# Altium integrated library Res-THP_V2.IntLib: 460 symbols (part 1 of 3)
Pins are listed as number, name and electrical type; pins without a type are passive.

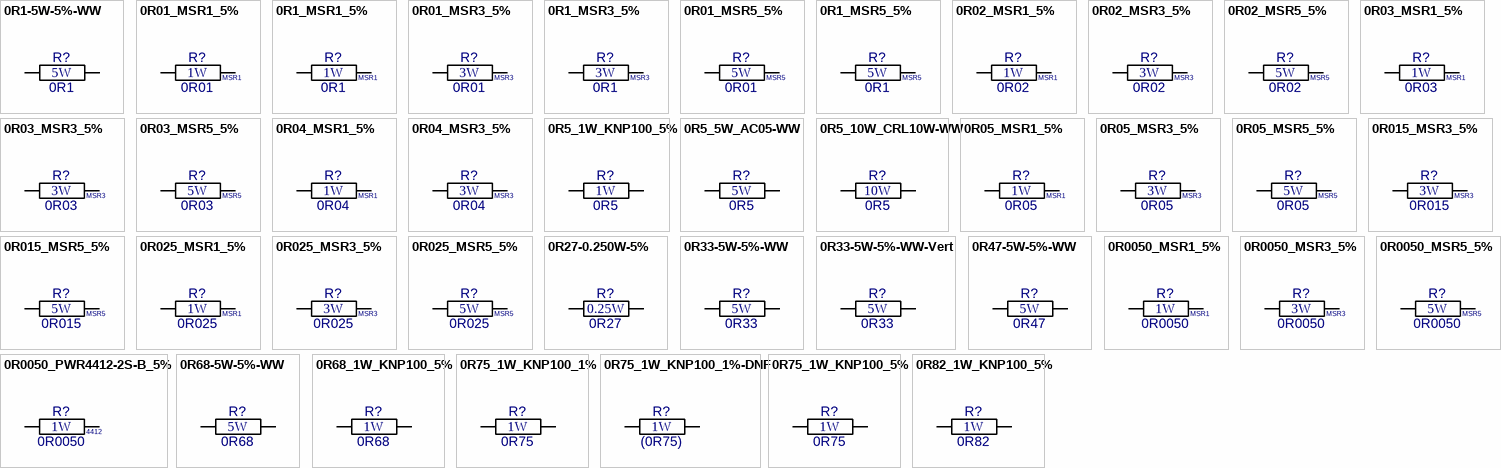
[diagram p0: symbols 0R1-5W-5%-WW to 0R82_1W_KNP100_5%]

## 0R1-5W-5%-WW
designator R?  value 0R1  Watt: 5W  (hidden comment: 0R1-5W-5%-WW)
Resistor Wirewound; Manufacturer: Various; Part Number: 0R1 5% 5W WW; Tol: 5%; Package: RES-5W-WW; EDM-PN: *; Text2: *; Text1: *
footprint Res-5W-WW (Res 5W WW 17.0x7.5mm)
pins: 1, 2

## 0R01_MSR1_5%
designator R?, comment value 0R01  Watt: 1W  Text1: MSR1  (hidden comment: MSR 1 R01 J)
Resistor Bare Metal Element; Manufacturer: Arcol; Tol: 5%; Part Number: MSR 1 R01 J; Package: RES-MSR1; EDM-PN: *; Text2: *
footprint RES-MSR1 (MSR1 11.43x4.8mm)
pins: 1, 2

## 0R1_MSR1_5%
designator R?  value 0R1  Watt: 1W  Text1: MSR1  (hidden comment: 0R1_MSR1_5%)
Resistor Bare Metal Element; Manufacturer: Arcol; Part Number: MSR 1 R1 J; Tol: 5%; Package: RES-MSR1; EDM-PN: *; Text2: *
footprint RES-MSR1 (MSR1 11.43x4.8mm)
pins: 1, 2

## 0R01_MSR3_5%
designator R?, comment value 0R01  Watt: 3W  Text1: MSR3  (hidden comment: MSR 3 R01 J)
Resistor Bare Metal Element; Manufacturer: Arcol; Tol: 5%; Part Number: MSR 3 R01 J; Package: RES-MSR3; EDM-PN: *; Text2: *
footprint RES-MSR3 (MSR3 15.2x4.8mm)
pins: 1, 2

## 0R1_MSR3_5%
designator R?  value 0R1  Watt: 3W  Text1: MSR3  (hidden comment: 0R1_MSR3_5%)
Resistor Bare Metal Element; Manufacturer: Arcol; Part Number: MSR 3 R1 J; Tol: 5%; Package: RES-MSR3; EDM-PN: *; Text2: *
footprint RES-MSR3 (MSR3 15.2x4.8mm)
pins: 1, 2

## 0R01_MSR5_5%
designator R?, comment value 0R01  Watt: 5W  Text1: MSR5  (hidden comment: MSR 5 R01 J)
Resistor Bare Metal Element; Manufacturer: Arcol; Tol: 5%; Part Number: MSR 5 R01 J; Package: RES-MSR5; EDM-PN: *; Text2: *
footprint RES-MSR5 (MSR5 20.3x4.8mm)
pins: 1, 2

## 0R1_MSR5_5%
designator R?  value 0R1  Watt: 5W  Text1: MSR5  (hidden comment: 0R1_MSR5_5%)
Resistor Bare Metal Element; Manufacturer: Arcol; Part Number: MSR 5 R1 J; Tol: 5%; Package: RES-MSR5; EDM-PN: *; Text2: *
footprint RES-MSR5 (MSR5 20.3x4.8mm)
pins: 1, 2

## 0R02_MSR1_5%
designator R?  value 0R02  Watt: 1W  Text1: MSR1  (hidden comment: 0R02_MSR1_5%)
Resistor Bare Metal Element; Manufacturer: Arcol; Part Number: MSR 1 R02 J; Tol: 5%; Package: RES-MSR1; EDM-PN: *; Text2: *
footprint RES-MSR1 (MSR1 11.43x4.8mm)
pins: 1, 2

## 0R02_MSR3_5%
designator R?  value 0R02  Watt: 3W  Text1: MSR3  (hidden comment: 0R02_MSR3_5%)
Resistor Bare Metal Element; Manufacturer: Arcol; Part Number: MSR 3 R02 J; Tol: 5%; Package: RES-MSR3; EDM-PN: *; Text2: *
footprint RES-MSR3 (MSR3 15.2x4.8mm)
pins: 1, 2

## 0R02_MSR5_5%
designator R?  value 0R02  Watt: 5W  Text1: MSR5  (hidden comment: 0R02_MSR5_5%)
Resistor Bare Metal Element; Manufacturer: Arcol; Part Number: MSR 5 R02 J; Tol: 5%; Package: RES-MSR5; EDM-PN: *; Text2: *
footprint RES-MSR5 (MSR5 20.3x4.8mm)
pins: 1, 2

## 0R03_MSR1_5%
designator R?  value 0R03  Watt: 1W  Text1: MSR1  (hidden comment: 0R03_MSR1_5%)
Resistor Bare Metal Element; Manufacturer: Arcol; Part Number: MSR 1 R03 J; Tol: 5%; Package: RES-MSR1; EDM-PN: *; Text2: *
footprint RES-MSR1 (MSR1 11.43x4.8mm)
pins: 1, 2

## 0R03_MSR3_5%
designator R?  value 0R03  Watt: 3W  Text1: MSR3  (hidden comment: 0R03_MSR3_5%)
Resistor Bare Metal Element; Manufacturer: Arcol; Part Number: MSR 3 R03 J; Tol: 5%; Package: RES-MSR3; EDM-PN: *; Text2: *
footprint RES-MSR3 (MSR3 15.2x4.8mm)
pins: 1, 2

## 0R03_MSR5_5%
designator R?  value 0R03  Watt: 5W  Text1: MSR5  (hidden comment: 0R03_MSR5_5%)
Resistor Bare Metal Element; Manufacturer: Arcol; Part Number: MSR 5 R03 J; Tol: 5%; Package: RES-MSR5; EDM-PN: *; Text2: *
footprint RES-MSR5 (MSR5 20.3x4.8mm)
pins: 1, 2

## 0R04_MSR1_5%
designator R?  value 0R04  Watt: 1W  Text1: MSR1  (hidden comment: 0R04_MSR1_5%)
Resistor Bare Metal Element; Manufacturer: Arcol; Part Number: MSR 1 R04 J; Tol: 5%; Package: RES-MSR1; EDM-PN: *; Text2: *
footprint RES-MSR1 (MSR1 11.43x4.8mm)
pins: 1, 2

## 0R04_MSR3_5%
designator R?  value 0R04  Watt: 3W  Text1: MSR3  (hidden comment: 0R04_MSR3_5%)
Resistor Bare Metal Element; Manufacturer: Arcol; Part Number: MSR 3 R04 J; Tol: 5%; Package: RES-MSR3; EDM-PN: *; Text2: *
footprint RES-MSR3 (MSR3 15.2x4.8mm)
pins: 1, 2

## 0R5_1W_KNP100_5%
designator R?, comment value 0R5  Watt: 1W  (hidden comment: 0R5_1W_KNP100_5%_H)
Resistor Wirewound; Manufacturer: Yageo; Part Number: KNP100JR-73-0R5; Tol: 5%; Package: RES-KNP100; EDM-PN: *; Text2: *; Text1: *
footprint RES-KNP100 (RES 1W PMW 11.5x4.5mm)
pins: 1, 2

## 0R5_5W_AC05-WW
designator R?, comment value 0R5  Watt: 5W  (hidden comment: 0R5-AC05-WW)
Resistor Wirewound; Manufacturer: Various; Part Number: 0R5 5% AC05; Tol: 5%; Package: RES-AC05; EDM-PN: *; Text2: *; Text1: *
footprint Res-AC05 (Res AC05 18.0x10.0mm)
pins: 1, 2

## 0R5_10W_CRL10W-WW
designator R?  value 0R5  Watt: 10W  (hidden comment: 0R5_10W_CRL10W-WW)
Resistor Wirewound Ceramic; Manufacturer: Various; Part Number: CRL10W-R51; Tol: 5%; Package: RES-CRL10W; EDM-PN: *; Text2: *; Text1: *
footprint RES-CRL10W (CRL10W  48.0x9.5mm)
pins: 1, 2

## 0R05_MSR1_5%
designator R?  value 0R05  Watt: 1W  Text1: MSR1  (hidden comment: 0R05_MSR1_5%)
Resistor Bare Metal Element; Manufacturer: Arcol; Part Number: MSR 1 R05 J; Tol: 5%; Package: RES-MSR1; EDM-PN: *; Text2: *
footprint RES-MSR1 (MSR1 11.43x4.8mm)
pins: 1, 2

## 0R05_MSR3_5%
designator R?  value 0R05  Watt: 3W  Text1: MSR3  (hidden comment: 0R05_MSR3_5%)
Resistor Bare Metal Element; Manufacturer: Arcol; Part Number: MSR 3 R05 J; Tol: 5%; Package: RES-MSR3; EDM-PN: *; Text2: *
footprint RES-MSR3 (MSR3 15.2x4.8mm)
pins: 1, 2

## 0R05_MSR5_5%
designator R?  value 0R05  Watt: 5W  Text1: MSR5  (hidden comment: 0R05_MSR5_5%)
Resistor Bare Metal Element; Manufacturer: Arcol; Part Number: MSR 5 R05 J; Tol: 5%; Package: RES-MSR5; EDM-PN: *; Text2: *
footprint RES-MSR5 (MSR5 20.3x4.8mm)
pins: 1, 2

## 0R015_MSR3_5%
designator R?  value 0R015  Watt: 3W  Text1: MSR3  (hidden comment: 0R015_MSR3_5%)
Resistor Bare Metal Element; Manufacturer: Arcol; Part Number: MSR 3 R015 J; Tol: 5%; Package: RES-MSR3; EDM-PN: *; Text2: *
footprint RES-MSR3 (MSR3 15.2x4.8mm)
pins: 1, 2

## 0R015_MSR5_5%
designator R?  value 0R015  Watt: 5W  Text1: MSR5  (hidden comment: 0R015_MSR5_5%)
Resistor Bare Metal Element; Manufacturer: Arcol; Part Number: MSR 5 R015 J; Tol: 5%; Package: RES-MSR5; EDM-PN: *; Text2: *
footprint RES-MSR5 (MSR5 20.3x4.8mm)
pins: 1, 2

## 0R025_MSR1_5%
designator R?  value 0R025  Watt: 1W  Text1: MSR1  (hidden comment: 0R025_MSR1_5%)
Resistor Bare Metal Element; Manufacturer: Arcol; Part Number: MSR 1 R025 J; Tol: 5%; Package: RES-MSR1; EDM-PN: *; Text2: *
footprint RES-MSR1 (MSR1 11.43x4.8mm)
pins: 1, 2

## 0R025_MSR3_5%
designator R?  value 0R025  Watt: 3W  Text1: MSR3  (hidden comment: 0R025_MSR3_5%)
Resistor Bare Metal Element; Manufacturer: Arcol; Part Number: MSR 3 R025 J; Tol: 5%; Package: RES-MSR3; EDM-PN: *; Text2: *
footprint RES-MSR3 (MSR3 15.2x4.8mm)
pins: 1, 2

## 0R025_MSR5_5%
designator R?  value 0R025  Watt: 5W  Text1: MSR5  (hidden comment: 0R025_MSR5_5%)
Resistor Bare Metal Element; Manufacturer: Arcol; Part Number: MSR 5 R025 J; Tol: 5%; Package: RES-MSR5; EDM-PN: *; Text2: *
footprint RES-MSR5 (MSR5 20.3x4.8mm)
pins: 1, 2

## 0R27-0.250W-5%
designator R?, comment value 0R27  Watt: 0.25W  (hidden comment: 0R27-0.250W-5%_H)
Resistor Metal Film; Manufacturer: Various; Part Number: 0R27 5% 0.25W; Tol: 5%; Package: RES-0.250W; EDM-PN: *; Text2: *; Text1: *
footprint RES-0.250W (Res 0.25W 7.6x2.3mm)
pins: 1, 2

## 0R33-5W-5%-WW
designator R?  value 0R33  Watt: 5W  (hidden comment: 0R33-5W-5%-WW)
Resistor Wirewound; Manufacturer: Various; Part Number: 0R33 5% 5W WW; Tol: 5%; Package: RES-5W-WW; EDM-PN: *; Text2: *; Text1: *
footprint Res-5W-WW (Res 5W WW 17.0x7.5mm)
pins: 1, 2

## 0R33-5W-5%-WW-Vert
designator R?, comment value 0R33  Watt: 5W  (hidden comment: 0R33-5W-5%-WW)
Resistor Wirewound; Manufacturer: Various; Part Number: 0R33 5% 5W WW; Tol: 5%; Package: RES-5W-WW-Vert; EDM-PN: *; Text2: *; Text1: *
footprint Res-5W-WW-Vert (Res AC05 18.0x10.0mm)
pins: 1, 2

## 0R47-5W-5%-WW
designator R?  value 0R47  Watt: 5W  (hidden comment: 0R47-5W-5%-WW)
Resistor Wirewound; Manufacturer: Various; Part Number: 0R47 5% 5W WW; EDM-PN: RES1410; Tol: 5%; Package: RES-5W-WW; Text2: *; Text1: *
footprint Res-5W-WW (Res 5W WW 17.0x7.5mm)
pins: 1, 2

## 0R0050_MSR1_5%
designator R?  value 0R0050  Watt: 1W  Text1: MSR1  (hidden comment: 0R0050_MSR1_5%)
Resistor Bare Metal Element; Manufacturer: Arcol; Part Number: MSR 1 R0050 J; Tol: 5%; Package: RES-MSR1; EDM-PN: *; Text2: *
footprint RES-MSR1 (MSR1 11.43x4.8mm)
pins: 1, 2

## 0R0050_MSR3_5%
designator R?  value 0R0050  Watt: 3W  Text1: MSR3  (hidden comment: 0R0050_MSR3_5%)
Resistor Bare Metal Element; Manufacturer: Arcol; Part Number: MSR 3 R0050 J; Tol: 5%; Package: RES-MSR3; EDM-PN: *; Text2: *
footprint RES-MSR3 (MSR3 15.2x4.8mm)
pins: 1, 2

## 0R0050_MSR5_5%
designator R?  value 0R0050  Watt: 5W  Text1: MSR5  (hidden comment: 0R0050_MSR5_5%)
Resistor Bare Metal Element; Manufacturer: Arcol; Part Number: MSR 5 R0050 J; Tol: 5%; Package: RES-MSR5; EDM-PN: *; Text2: *
footprint RES-MSR5 (MSR5 20.3x4.8mm)
pins: 1, 2

## 0R0050_PWR4412-2S-B_5%
designator R?  value 0R0050  Watt: 1W  Text1: 4412  (hidden comment: 0R0050_PWR4412-2S-B_5%)
Resistor Bare Metal Element; Manufacturer: Bourns; Part Number: PWR4412-2S B R0050 J; Tol: 5%; Package: PWR4412-2S-B; EDM-PN: *; Text2: *
footprint PWR4412-2S-B (PWR4412-2S-B 11.43x4.8mm)
pins: 1, 2

## 0R68-5W-5%-WW
designator R?  value 0R68  Watt: 5W  (hidden comment: 0R68-5W-5%-WW)
Resistor Wirewound; Manufacturer: Various; Part Number: 0R68 5% 5W WW; Tol: 5%; Package: RES-5W-WW; EDM-PN: *; Text2: *; Text1: *
footprint Res-5W-WW (Res 5W WW 17.0x7.5mm)
pins: 1, 2

## 0R68_1W_KNP100_5%
designator R?, comment value 0R68  Watt: 1W  (hidden comment: 0R68_1W_KNP100_5%_H)
Resistor Wirewound; Manufacturer: Yageo; Part Number: KNP100JR-73-0R68; Tol: 5%; Package: RES-KNP100; EDM-PN: *; Text2: *; Text1: *
footprint RES-KNP100 (RES 1W PMW 11.5x4.5mm)
pins: 1, 2

## 0R75_1W_KNP100_1%
designator R?, comment value 0R75  Watt: 1W  (hidden comment: 0R75_1W_KNP100_1%_H)
Resistor Wirewound; Manufacturer: Yageo; Part Number: KNP100FB-0R75; Tol: 1%; Package: RES-KNP100; EDM-PN: *; Text2: *; Text1: *
footprint RES-KNP100 (RES 1W PMW 11.5x4.5mm)
pins: 1, 2

## 0R75_1W_KNP100_1%-DNF
designator R?, comment value (0R75)  Watt: 1W  (hidden comment: 0R75_1W_KNP100_1%_-DNF)
Resistor Wirewound - Do not Fit; Manufacturer: Yageo; Part Number: DNF - KNP100FB-0R75; Tol: 1%; Package: RES-KNP100; EDM-PN: *; Text2: *; Text1: *
footprint RES-KNP100 (RES 1W PMW 11.5x4.5mm)
pins: 1, 2

## 0R75_1W_KNP100_5%
designator R?, comment value 0R75  Watt: 1W  (hidden comment: 0R75_1W_KNP100_5%_H)
Resistor Wirewound; Manufacturer: Yageo; Part Number: KNP100JB-0R75; Tol: 5%; Package: RES-KNP100; EDM-PN: *; Text2: *; Text1: *
footprint RES-KNP100 (RES 1W PMW 11.5x4.5mm)
pins: 1, 2

## 0R82_1W_KNP100_5%
designator R?, comment value 0R82  Watt: 1W  (hidden comment: 0R82_1W_KNP100_5%_H)
Resistor Wirewound; Manufacturer: Yageo; Part Number: KNP100JR-73-0R82; Tol: 5%; Reutech PN: 5905-WW-0133; Package: RES-KNP100; EDM-PN: *; Text2: *; Text1: *
footprint RES-KNP100 (RES 1W PMW 11.5x4.5mm)
pins: 1, 2

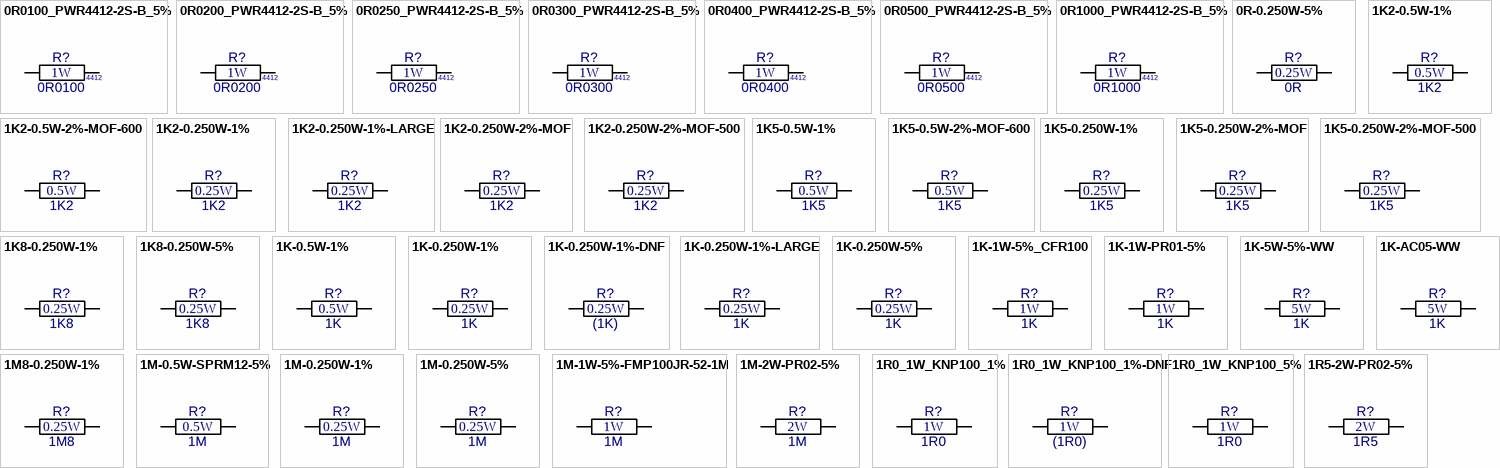
[diagram p1: symbols 0R0100_PWR4412-2S-B_5% to 1R5-2W-PR02-5%]

## 0R0100_PWR4412-2S-B_5%
designator R?  value 0R0100  Watt: 1W  Text1: 4412  (hidden comment: 0R0100_PWR4412-2S-B_5%)
Resistor Bare Metal Element; Manufacturer: Bourns; Part Number: PWR4412-2S B R0100 J; Tol: 5%; Package: PWR4412-2S-B; EDM-PN: *; Text2: *
footprint PWR4412-2S-B (PWR4412-2S-B 11.43x4.8mm)
pins: 1, 2

## 0R0200_PWR4412-2S-B_5%
designator R?  value 0R0200  Watt: 1W  Text1: 4412  (hidden comment: 0R0200_PWR4412-2S-B_5%)
Resistor Bare Metal Element; Manufacturer: Bourns; Part Number: PWR4412-2S B R0200 J; Tol: 5%; Package: PWR4412-2S-B; EDM-PN: *; Text2: *
footprint PWR4412-2S-B (PWR4412-2S-B 11.43x4.8mm)
pins: 1, 2

## 0R0250_PWR4412-2S-B_5%
designator R?  value 0R0250  Watt: 1W  Text1: 4412  (hidden comment: 0R0250_PWR4412-2S-B_5%)
Resistor Bare Metal Element; Manufacturer: Bourns; Part Number: PWR4412-2S B R0250 J; Tol: 5%; Package: PWR4412-2S-B; EDM-PN: *; Text2: *
footprint PWR4412-2S-B (PWR4412-2S-B 11.43x4.8mm)
pins: 1, 2

## 0R0300_PWR4412-2S-B_5%
designator R?  value 0R0300  Watt: 1W  Text1: 4412  (hidden comment: 0R0300_PWR4412-2S-B_5%)
Resistor Bare Metal Element; Manufacturer: Bourns; Part Number: PWR4412-2S B R0300 J; Tol: 5%; Package: PWR4412-2S-B; EDM-PN: *; Text2: *
footprint PWR4412-2S-B (PWR4412-2S-B 11.43x4.8mm)
pins: 1, 2

## 0R0400_PWR4412-2S-B_5%
designator R?  value 0R0400  Watt: 1W  Text1: 4412  (hidden comment: 0R0400_PWR4412-2S-B_5%)
Resistor Bare Metal Element; Manufacturer: Bourns; Part Number: PWR4412-2S B R0400 J; Tol: 5%; Package: PWR4412-2S-B; EDM-PN: *; Text2: *
footprint PWR4412-2S-B (PWR4412-2S-B 11.43x4.8mm)
pins: 1, 2

## 0R0500_PWR4412-2S-B_5%
designator R?  value 0R0500  Watt: 1W  Text1: 4412  (hidden comment: 0R0500_PWR4412-2S-B_5%)
Resistor Bare Metal Element; Manufacturer: Bourns; Part Number: PWR4412-2S B R0500 J; Tol: 5%; Package: PWR4412-2S-B; EDM-PN: *; Text2: *
footprint PWR4412-2S-B (PWR4412-2S-B 11.43x4.8mm)
pins: 1, 2

## 0R1000_PWR4412-2S-B_5%
designator R?  value 0R1000  Watt: 1W  Text1: 4412  (hidden comment: 0R1000_PWR4412-2S-B_5%)
Resistor Bare Metal Element; Manufacturer: Bourns; Part Number: PWR4412-2S B R1000 J; Tol: 5%; Package: PWR4412-2S-B; EDM-PN: *; Text2: *
footprint PWR4412-2S-B (PWR4412-2S-B 11.43x4.8mm)
pins: 1, 2

## 0R-0.250W-5%
designator R?, comment value 0R  Watt: 0.25W  (hidden comment: 0R-0.250W-5%_H)
Resistor Metal Film; Manufacturer: Various; Part Number: 0R 5% 0.25W; Tol: 5%; Package: RES-0.250W; EDM-PN: *; Text2: *; Text1: *
footprint RES-0.250W (Res 0.25W 7.6x2.3mm)
pins: 1, 2

## 1K2-0.5W-1%
designator R?, comment value 1K2  Watt: 0.5W  (hidden comment: 1K2-0.5W-1%_H)
Resistor Metal Film; Manufacturer: Various; Part Number: 1K2 1% 0.5W; Tol: 1%; Package: RES-0.5W; EDM-PN: *; Text2: *; Text1: *
footprint RES-0.5W (RES-0.5W 10.0x3.8mm)
pins: 1, 2

## 1K2-0.5W-2%-MOF-600
designator R?, comment value 1K2  Watt: 0.5W  (hidden comment: 1K2-0.5W-2%)
Resistor Metal Oxide Film; Manufacturer: Various; Part Number: 1K2 2% 0.5W MOF; Tol: 2%; Package: RES-0.5W-600; EDM-PN: *; Text2: *; Text1: *
footprint RES-0.5W-600 (RES-0.5W 10.0x3.8mm)
pins: 1, 2

## 1K2-0.250W-1%
designator R?, comment value 1K2  Watt: 0.25W  (hidden comment: 1K2-0.250W-1%_H)
Resistor Metal Film; Manufacturer: Various; Part Number: 1K2 1% 0.25W; Tol: 1%; Package: RES-0.250W; EDM-PN: *; Text2: *; Text1: *
footprint RES-0.250W (Res 0.25W 7.6x2.3mm)
pins: 1, 2

## 1K2-0.250W-1%-LARGE
designator R?, comment value 1K2  Watt: 0.25W  (hidden comment: 1K2-0.250W-1%_H)
Resistor Metal Film; Manufacturer: Various; Part Number: 1K2 1% 0.25W; Tol: 1%; Package: RES-0.250W-LARGE; EDM-PN: *; Text2: *; Text1: *
footprint RES-0.250W-LARGE (Res 0.25W 7.6x2.3mm)
pins: 1, 2

## 1K2-0.250W-2%-MOF
designator R?, comment value 1K2  Watt: 0.25W  (hidden comment: 1K2-0.250W-2%)
Resistor Metal Oxide Film; Manufacturer: Various; Part Number: 1K2 2% 0.25W MOF; Tol: 2%; Package: RES-0.250W; EDM-PN: *; Text2: *; Text1: *
footprint RES-0.250W (Res 0.25W 7.6x2.3mm)
pins: 1, 2

## 1K2-0.250W-2%-MOF-500
designator R?, comment value 1K2  Watt: 0.25W  (hidden comment: 1K2-0.250W-2%)
Resistor Metal Oxide Film; Manufacturer: Various; Part Number: 1K2 2% 0.25W MOF; Tol: 2%; Package: RES-0.250W-500; EDM-PN: *; Text2: *; Text1: *
footprint RES-0.250W-500 (Res 0.25W 7.6x2.3mm)
pins: 1, 2

## 1K5-0.5W-1%
designator R?, comment value 1K5  Watt: 0.5W  (hidden comment: 1K5-0.5W-1%_H)
Resistor Metal Film; Manufacturer: Various; Part Number: 1K5 1% 0.5W; Tol: 1%; Package: RES-0.5W; EDM-PN: *; Text2: *; Text1: *
footprint RES-0.5W (RES-0.5W 10.0x3.8mm)
pins: 1, 2

## 1K5-0.5W-2%-MOF-600
designator R?, comment value 1K5  Watt: 0.5W  (hidden comment: 1K5-0.5W-2%_H)
Resistor Metal Oxide Film; Manufacturer: Various; Part Number: 1K5 2% 0.5W MOF; Tol: 2%; Package: RES-0.5W-600; EDM-PN: *; Text2: *; Text1: *
footprint RES-0.5W-600 (RES-0.5W 10.0x3.8mm)
pins: 1, 2

## 1K5-0.250W-1%
designator R?, comment value 1K5  Watt: 0.25W  (hidden comment: 1K5-0.250W-1%_H)
Resistor Metal Film; Manufacturer: Various; Part Number: 1K5 1% 0.25W; Tol: 1%; Package: RES-0.250W; EDM-PN: *; Text2: *; Text1: *
footprint RES-0.250W (Res 0.25W 7.6x2.3mm)
pins: 1, 2

## 1K5-0.250W-2%-MOF
designator R?, comment value 1K5  Watt: 0.25W  (hidden comment: 1K5-0.250W-2%)
Resistor Metal Oxide Film; Manufacturer: Various; Part Number: 1K5 2% 0.25W MOF; Tol: 2%; Package: RES-0.250W; EDM-PN: *; Text2: *; Text1: *
footprint RES-0.250W (Res 0.25W 7.6x2.3mm)
pins: 1, 2

## 1K5-0.250W-2%-MOF-500
designator R?, comment value 1K5  Watt: 0.25W  (hidden comment: 1K5-0.250W-2%)
Resistor Metal Oxide Film; Manufacturer: Various; Part Number: 1K5 2% 0.25W MOF; Tol: 2%; Package: RES-0.250W-500; EDM-PN: *; Text2: *; Text1: *
footprint RES-0.250W-500 (Res 0.25W 7.6x2.3mm)
pins: 1, 2

## 1K8-0.250W-1%
designator R?, comment value 1K8  Watt: 0.25W  (hidden comment: 1K8-0.250W-1%_H)
Resistor Metal Film; Manufacturer: Various; Part Number: 1K8 1% 0.25W; Tol: 1%; Package: RES-0.250W; EDM-PN: *; Text2: *; Text1: *
footprint RES-0.250W (Res 0.25W 7.6x2.3mm)
pins: 1, 2

## 1K8-0.250W-5%
designator R?, comment value 1K8  Watt: 0.25W  (hidden comment: 1K8-0.250W-5%_H)
Resistor Carbon; Manufacturer: Various; Part Number: 1K8 5% 0.25W; Tol: 5%; Package: RES-0.250W; EDM-PN: *; Text2: *; Text1: *
footprint RES-0.250W (Res 0.25W 7.6x2.3mm)
pins: 1, 2

## 1K-0.5W-1%
designator R?, comment value 1K  Watt: 0.5W  (hidden comment: 1K-0.5W-1%_H)
Resistor Metal Film; Manufacturer: Various; Part Number: 1K 1% 0.5W; Tol: 1%; Package: RES-0.5W; EDM-PN: *; Text2: *; Text1: *
footprint RES-0.5W (RES-0.5W 10.0x3.8mm)
pins: 1, 2

## 1K-0.250W-1%
designator R?, comment value 1K  Watt: 0.25W  (hidden comment: 1K-0.250W-1%_H)
Resistor Metal Film; Manufacturer: Various; Part Number: 1K 1% 0.25W; Tol: 1%; Package: RES-0.250W; EDM-PN: *; Text2: *; Text1: *
footprint RES-0.250W (Res 0.25W 7.6x2.3mm)
pins: 1, 2

## 1K-0.250W-1%-DNF
designator R?, comment value (1K)  Watt: 0.25W  (hidden comment: 1K-0.250W-1%_H-DNF)
Resistor Metal Film - Do not Fit; Manufacturer: Various; Part Number: DNF - 1K 1% 0.25W; Tol: 1%; Package: RES-0.250W; EDM-PN: *; Text2: *; Text1: *
footprint RES-0.250W (Res 0.25W 7.6x2.3mm)
pins: 1, 2

## 1K-0.250W-1%-LARGE
designator R?, comment value 1K  Watt: 0.25W  (hidden comment: 1K-0.250W-1%_H)
Resistor Metal Film; Manufacturer: Various; Part Number: 1K 1% 0.25W; Tol: 1%; Package: RES-0.250W-LARGE; EDM-PN: *; Text2: *; Text1: *
footprint RES-0.250W-LARGE (Res 0.25W 7.6x2.3mm)
pins: 1, 2

## 1K-0.250W-5%
designator R?, comment value 1K  Watt: 0.25W  (hidden comment: 1K-0.250W-5%_H)
Resistor Carbon; Manufacturer: Various; Part Number: 1K 5% 0.25W; Tol: 5%; Package: RES-0.250W; EDM-PN: *; Text2: *; Text1: *
footprint RES-0.250W (Res 0.25W 7.6x2.3mm)
pins: 1, 2

## 1K-1W-5%_CFR100
designator R?, comment value 1K  Watt: 1W  (hidden comment: 1K-1W-5%_CFR100_H)
Resistor Carbon Film; Manufacturer: Tyco; Part Number: CFR100J1K0; Tol: 5%; Package: RES-CFR100; EDM-PN: *; Text2: *; Text1: *
footprint RES-CFR100 (RES CFR100 12.0x5.0mm)
pins: 1, 2

## 1K-1W-PR01-5%
designator R?  value 1K  Watt: 1W  (hidden comment: 1K-1W-PR01-5%)
Resistor Power Metal Film; Manufacturer: Various; Part Number: 1K 5% 1W; Tol: 5%; Package: RES-PR01; EDM-PN: *; Text2: *; Text1: *
footprint RES-PR01 (RES-PR01 6.5x2.5mm)
pins: 1, 2

## 1K-5W-5%-WW
designator R?  value 1K  Watt: 5W  (hidden comment: 1K-5W-5%-WW)
Resistor Wirewound; Manufacturer: Various; Part Number: 1K 5% 5W WW; Tol: 5%; Package: RES-5W-WW; EDM-PN: *; Text2: *; Text1: *
footprint Res-5W-WW (Res 5W WW 17.0x7.5mm)
pins: 1, 2

## 1K-AC05-WW
designator R?  value 1K  Watt: 5W  (hidden comment: 1K-AC05-WW)
Resistor Wirewound; Manufacturer: Various; Part Number: 1K 5% AC05; Tol: 5%; Package: RES-AC05; EDM-PN: *; Text2: *; Text1: *
footprint Res-AC05 (Res AC05 18.0x10.0mm)
pins: 1, 2

## 1M8-0.250W-1%
designator R?, comment value 1M8  Watt: 0.25W  (hidden comment: 1M8-0.250W-1%_H)
Resistor Metal Film; Manufacturer: Various; Part Number: 1M8 1% 0.25W; Tol: 1%; Package: RES-0.250W; EDM-PN: *; Text2: *; Text1: *
footprint RES-0.250W (Res 0.25W 7.6x2.3mm)
pins: 1, 2

## 1M-0.5W-SPRM12-5%
designator R?  value 1M  Watt: 0.5W  (hidden comment: 1M-0.5W-SPRM12-5%)
Resistor Wirewound; Manufacturer: Stackpole; Part Number: SPRM12JA1M00; Tol: 5%; Package: RES-PR02; EDM-PN: *; Text2: *; Text1: *
footprint RES-SPRM12 (RES SPRM12 9.0x3.0mm)
pins: 1, 2

## 1M-0.250W-1%
designator R?, comment value 1M  Watt: 0.25W  (hidden comment: 1M-0.250W-1%_H)
Resistor Metal Film; Manufacturer: Various; Part Number: 1M 1% 0.25W; Tol: 1%; Package: RES-0.250W; EDM-PN: *; Text2: *; Text1: *
footprint RES-0.250W (Res 0.25W 7.6x2.3mm)
pins: 1, 2

## 1M-0.250W-5%
designator R?, comment value 1M  Watt: 0.25W  (hidden comment: 1M-0.250W-5%_H)
Resistor Carbon; Manufacturer: Various; Part Number: 1M 5% 0.25W; Tol: 5%; Package: RES-0.250W; EDM-PN: *; Text2: *; Text1: *
footprint RES-0.250W (Res 0.25W 7.6x2.3mm)
pins: 1, 2

## 1M-1W-5%-FMP100JR-52-1M
designator R?, comment value 1M  Watt: 1W  (hidden comment: FMP100JR-52-1M)
Resistor Axial Flame Proof, Safety Metal Film; Manufacturer: Yageo; Tol: 5%; Part Number: FMP100JR-52-1M; Package: RES-FMP100; EDM-PN: *; Text2: *; Text1: *
footprint RES-FMP100 (RES-FMP100 6.3x2.4mm)
pins: 1, 2

## 1M-2W-PR02-5%
designator R?  value 1M  Watt: 2W  (hidden comment: 1M-2W-PR02-5%)
Resistor Power Metal Film; Manufacturer: Various; Part Number: 1M 5% 2W; Tol: 5%; Package: RES-PR02; EDM-PN: *; Text2: *; Text1: *
footprint RES-PR02 (RES 2W PMW 10.0x3.9mm)
pins: 1, 2

## 1R0_1W_KNP100_1%
designator R?, comment value 1R0  Watt: 1W  (hidden comment: 1R0_1W_KNP100_1%_H)
Resistor Wirewound; Manufacturer: Yageo; Part Number: KNP100FB-1R0; Tol: 1%; Package: RES-KNP100; EDM-PN: *; Text2: *; Text1: *
footprint RES-KNP100 (RES 1W PMW 11.5x4.5mm)
pins: 1, 2

## 1R0_1W_KNP100_1%-DNF
designator R?, comment value (1R0)  Watt: 1W  (hidden comment: 1R0_1W_KNP100_1%_H-DNF)
Resistor Wirewound - Do not Fit; Manufacturer: Yageo; Part Number: DNF - KNP100FB-1R0; Tol: 1%; Package: RES-KNP100; EDM-PN: *; Text2: *; Text1: *
footprint RES-KNP100 (RES 1W PMW 11.5x4.5mm)
pins: 1, 2

## 1R0_1W_KNP100_5%
designator R?, comment value 1R0  Watt: 1W  (hidden comment: 1R0_1W_KNP100_5%_H)
Resistor Wirewound; Manufacturer: Yageo; Part Number: KNP100JB-1R0; Tol: 5%; Package: RES-KNP100; EDM-PN: *; Text2: *; Text1: *
footprint RES-KNP100 (RES 1W PMW 11.5x4.5mm)
pins: 1, 2

## 1R5-2W-PR02-5%
designator R?  value 1R5  Watt: 2W  (hidden comment: 1R5-2W-PR02-5%)
Resistor Power Metal Film; Manufacturer: Various; Part Number: 1R5 5% 2W; Tol: 5%; Package: RES-PR02; EDM-PN: *; Text2: *; Text1: *
footprint RES-PR02 (RES 2W PMW 10.0x3.9mm)
pins: 1, 2

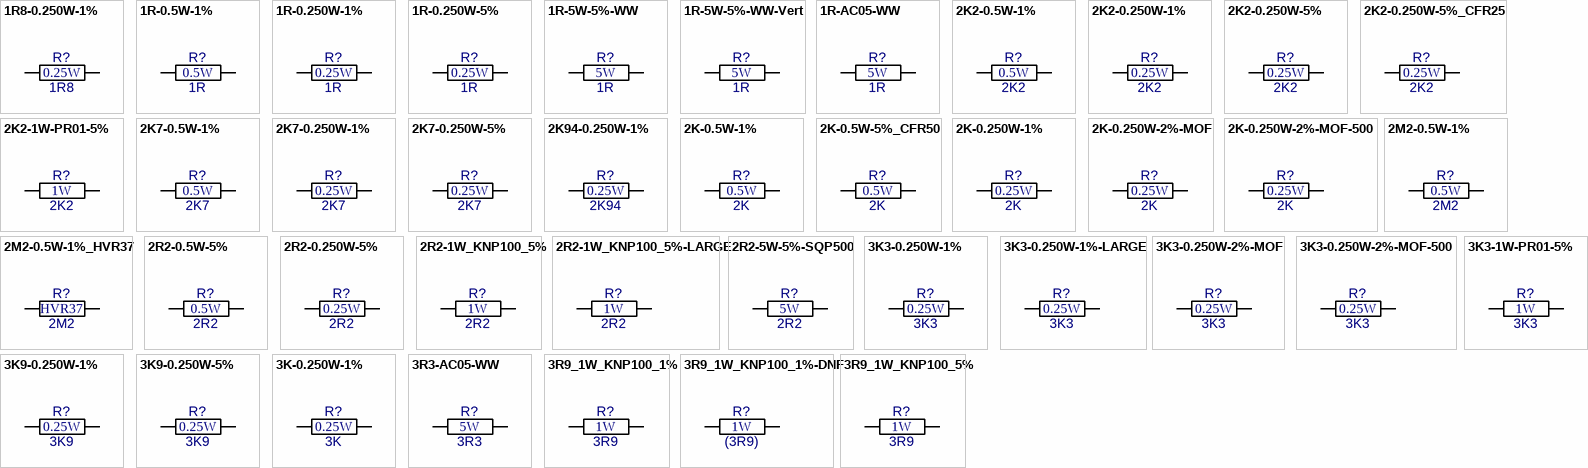
[diagram p2: symbols 1R8-0.250W-1% to 3R9_1W_KNP100_5%]

## 1R8-0.250W-1%
designator R?, comment value 1R8  Watt: 0.25W  (hidden comment: 1R8-0.250W-1%_H)
Resistor Metal Film; Manufacturer: Various; Part Number: 1R8 1% 0.25W; Tol: 1%; Package: RES-0.250W; EDM-PN: *; Text2: *; Text1: *
footprint RES-0.250W (Res 0.25W 7.6x2.3mm)
pins: 1, 2

## 1R-0.5W-1%
designator R?, comment value 1R  Watt: 0.5W  (hidden comment: 1R-0.5W-1%_H)
Resistor Metal Film; Manufacturer: Various; Part Number: 1R 1% 0.5W; Tol: 1%; Package: RES-0.5W; EDM-PN: *; Text2: *; Text1: *
footprint RES-0.5W (RES-0.5W 10.0x3.8mm)
pins: 1, 2

## 1R-0.250W-1%
designator R?, comment value 1R  Watt: 0.25W  (hidden comment: 1R-0.250W-1%_H)
Resistor Metal Film; Manufacturer: Various; Part Number: 1R 1% 0.25W; Tol: 1%; Package: RES-0.250W; EDM-PN: *; Text2: *; Text1: *
footprint RES-0.250W (Res 0.25W 7.6x2.3mm)
pins: 1, 2

## 1R-0.250W-5%
designator R?, comment value 1R  Watt: 0.25W  (hidden comment: 1R-0.250W-5%_H)
Resistor Carbon; Manufacturer: Various; Part Number: 1R 5% 0.25W; Tol: 5%; Package: RES-0.250W; EDM-PN: *; Text2: *; Text1: *
footprint RES-0.250W (Res 0.25W 7.6x2.3mm)
pins: 1, 2

## 1R-5W-5%-WW
designator R?  value 1R  Watt: 5W  (hidden comment: 1R-5W-5%-WW)
Resistor Wirewound; Manufacturer: Various; Part Number: 1R 5% 5W WW; Tol: 5%; Package: RES-5W-WW; EDM-PN: *; Text2: *; Text1: *
footprint Res-5W-WW (Res 5W WW 17.0x7.5mm)
pins: 1, 2

## 1R-5W-5%-WW-Vert
designator R?, comment value 1R  Watt: 5W  (hidden comment: 1R-5W-5%-WW)
Resistor Wirewound; Manufacturer: Various; Part Number: 1R 5% 5W WW; Tol: 5%; Package: RES-5W-WW-Vert; EDM-PN: *; Text2: *; Text1: *
footprint Res-5W-WW-Vert (Res AC05 18.0x10.0mm)
pins: 1, 2

## 1R-AC05-WW
designator R?  value 1R  Watt: 5W  (hidden comment: 1R-AC05-WW)
Resistor Wirewound; Manufacturer: Various; Part Number: 1R 5% AC05; Tol: 5%; Package: RES-AC05; EDM-PN: *; Text2: *; Text1: *
footprint Res-AC05 (Res AC05 18.0x10.0mm)
pins: 1, 2

## 2K2-0.5W-1%
designator R?, comment value 2K2  Watt: 0.5W  (hidden comment: 2K2-0.5W-1%_H)
Resistor Metal Film; Manufacturer: Various; Part Number: 2K2 1% 0.5W; Tol: 1%; Package: RES-0.5W; EDM-PN: *; Text2: *; Text1: *
footprint RES-0.5W (RES-0.5W 10.0x3.8mm)
pins: 1, 2

## 2K2-0.250W-1%
designator R?, comment value 2K2  Watt: 0.25W  (hidden comment: 2K2-0.250W-1%_H)
Resistor Metal Film; Manufacturer: Various; Part Number: 2K2 1% 0.25W; Tol: 1%; Package: RES-0.250W; EDM-PN: *; Text2: *; Text1: *
footprint RES-0.250W (Res 0.25W 7.6x2.3mm)
pins: 1, 2

## 2K2-0.250W-5%
designator R?, comment value 2K2  Watt: 0.25W  (hidden comment: 2K2-0.250W-5%_H)
Resistor Carbon; Manufacturer: Various; Part Number: 2K2 5% 0.25W; Tol: 5%; Package: RES-0.250W; EDM-PN: *; Text2: *; Text1: *
footprint RES-0.250W (Res 0.25W 7.6x2.3mm)
pins: 1, 2

## 2K2-0.250W-5%_CFR25
designator R?, comment value 2K2  Watt: 0.25W  (hidden comment: 2K2-0.250W-5%_CFR25_H)
Resistor Carbon Film; Manufacturer: Tyco; Part Number: CFR25J2K2; Tol: 5%; Package: RES-0.250W; EDM-PN: *; Text2: *; Text1: *
footprint RES-0.250W (Res 0.25W 7.6x2.3mm)
pins: 1, 2

## 2K2-1W-PR01-5%
designator R?  value 2K2  Watt: 1W  (hidden comment: 2K2-1W-PR01-5%)
Resistor Power Metal Film; Manufacturer: Various; Part Number: 2K2 5% 1W; Tol: 5%; Package: RES-PR01; EDM-PN: *; Text2: *; Text1: *
footprint RES-PR01 (RES-PR01 6.5x2.5mm)
pins: 1, 2

## 2K7-0.5W-1%
designator R?, comment value 2K7  Watt: 0.5W  (hidden comment: 2K7-0.5W-1%_H)
Resistor Metal Film; Manufacturer: Various; Part Number: 2K7 1% 0.5W; Tol: 1%; Package: RES-0.5W; EDM-PN: *; Text2: *; Text1: *
footprint RES-0.5W (RES-0.5W 10.0x3.8mm)
pins: 1, 2

## 2K7-0.250W-1%
designator R?, comment value 2K7  Watt: 0.25W  (hidden comment: 2K7-0.250W-1%_H)
Resistor Metal Film; Manufacturer: Various; Part Number: 2K7 1% 0.25W; Tol: 1%; Package: RES-0.250W; EDM-PN: *; Text2: *; Text1: *
footprint RES-0.250W (Res 0.25W 7.6x2.3mm)
pins: 1, 2

## 2K7-0.250W-5%
designator R?, comment value 2K7  Watt: 0.25W  (hidden comment: 2K7-0.250W-5%_H)
Resistor Carbon; Manufacturer: Various; Part Number: 2K7 5% 0.25W; Tol: 5%; Package: RES-0.250W; EDM-PN: *; Text2: *; Text1: *
footprint RES-0.250W (Res 0.25W 7.6x2.3mm)
pins: 1, 2

## 2K94-0.250W-1%
designator R?, comment value 2K94  Watt: 0.25W  (hidden comment: 2K94-0.250W-1%_H)
Resistor Metal Film; Manufacturer: Various; Part Number: 2K94 1% 0.25W; Tol: 1%; Package: RES-0.250W; EDM-PN: *; Text2: *; Text1: *
footprint RES-0.250W (Res 0.25W 7.6x2.3mm)
pins: 1, 2

## 2K-0.5W-1%
designator R?, comment value 2K  Watt: 0.5W  (hidden comment: 2K0-0.5W-1%_H)
Resistor Metal Film; Manufacturer: Various; Part Number: 2K 1% 0.5W; Tol: 1%; Package: RES-0.5W; EDM-PN: *; Text2: *; Text1: *
footprint RES-0.5W (RES-0.5W 10.0x3.8mm)
pins: 1, 2

## 2K-0.5W-5%_CFR50
designator R?, comment value 2K  Watt: 0.5W  (hidden comment: 2K-0.5W-5%_CFR50_H)
Resistor Carbon Film; Manufacturer: Tyco; Part Number: CFR50J2K0; Tol: 5%; Package: RES-CFR50; EDM-PN: *; Text2: *; Text1: *
footprint RES-CFR50 (RES CFR50 9.0x3.0mm)
pins: 1, 2

## 2K-0.250W-1%
designator R?  value 2K  Watt: 0.25W  (hidden comment: 2K-0.250W-1%)
Resistor Metal Film; Manufacturer: Various; Part Number: 2K 1% 0.25W; Tol: 1%; Package: RES-0.250W; EDM-PN: *; Text2: *; Text1: *
footprint RES-0.250W (Res 0.25W 7.6x2.3mm)
pins: 1, 2

## 2K-0.250W-2%-MOF
designator R?, comment value 2K  Watt: 0.25W  (hidden comment: 2K-0.250W-2%)
Resistor Metal Oxide Film; Manufacturer: Various; Part Number: 2K 2% 0.25W MOF; Tol: 2%; Package: RES-0.250W; EDM-PN: *; Text2: *; Text1: *
footprint RES-0.250W (Res 0.25W 7.6x2.3mm)
pins: 1, 2

## 2K-0.250W-2%-MOF-500
designator R?, comment value 2K  Watt: 0.25W  (hidden comment: 2K-0.250W-2%)
Resistor Metal Oxide Film; Manufacturer: Various; Part Number: 2K 2% 0.25W MOF; Tol: 2%; Package: RES-0.250W-500; EDM-PN: *; Text2: *; Text1: *
footprint RES-0.250W-500 (Res 0.25W 7.6x2.3mm)
pins: 1, 2

## 2M2-0.5W-1%
designator R?, comment value 2M2  Watt: 0.5W  (hidden comment: 2M2-0.5W-1%_H)
Resistor Metal Film; Manufacturer: Various; Part Number: 2M2 1% 0.5W; Tol: 1%; Package: RES-0.5W; EDM-PN: *; Text2: *; Text1: *
footprint RES-0.5W (RES-0.5W 10.0x3.8mm)
pins: 1, 2

## 2M2-0.5W-1%_HVR37
designator R?, comment value 2M2  Watt: HVR37  (hidden comment: 2M2-0.5W-1%_HVR37_H)
Resistor Metal Film Safety; Manufacturer: Vishay; Part Number: HVR3700002204FR500; Tol: 1%; Package: RES-0.5W; EDM-PN: *; Text2: *; Text1: *
footprint RES-0.5W (RES-0.5W 10.0x3.8mm)
pins: 1, 2

## 2R2-0.5W-5%
designator R?  value 2R2  Watt: 0.5W  (hidden comment: 2R2-0.5W-5%)
Resistor Metal Film; Manufacturer: Various; Part Number: 2R2 5% 0.5W; Tol: 5%; Package: RES-0.5W; EDM-PN: *; Text2: *; Text1: *
footprint RES-0.5W (RES-0.5W 10.0x3.8mm)
pins: 1, 2

## 2R2-0.250W-5%
designator R?  value 2R2  Watt: 0.25W  (hidden comment: 2R2-0.250W-5%)
Resistor Carbon; Manufacturer: Various; Part Number: 2R2 5% 0.25W; Tol: 5%; Package: RES-0.250W; EDM-PN: *; Text2: *; Text1: *
footprint RES-0.250W (Res 0.25W 7.6x2.3mm)
pins: 1, 2
